# Altium footprint library ESP8266.PcbLib: 13 footprints
Each footprint in its own frame and in the unit in brackets; x right, y up, seen from the top. Pads: shape width x height; smd on the part's side, far side on the other; paste and mask are expansions set on the pad; w line width, h text height; cw(c..) or ccw(c..) is an arc to the next point about the centre after c.
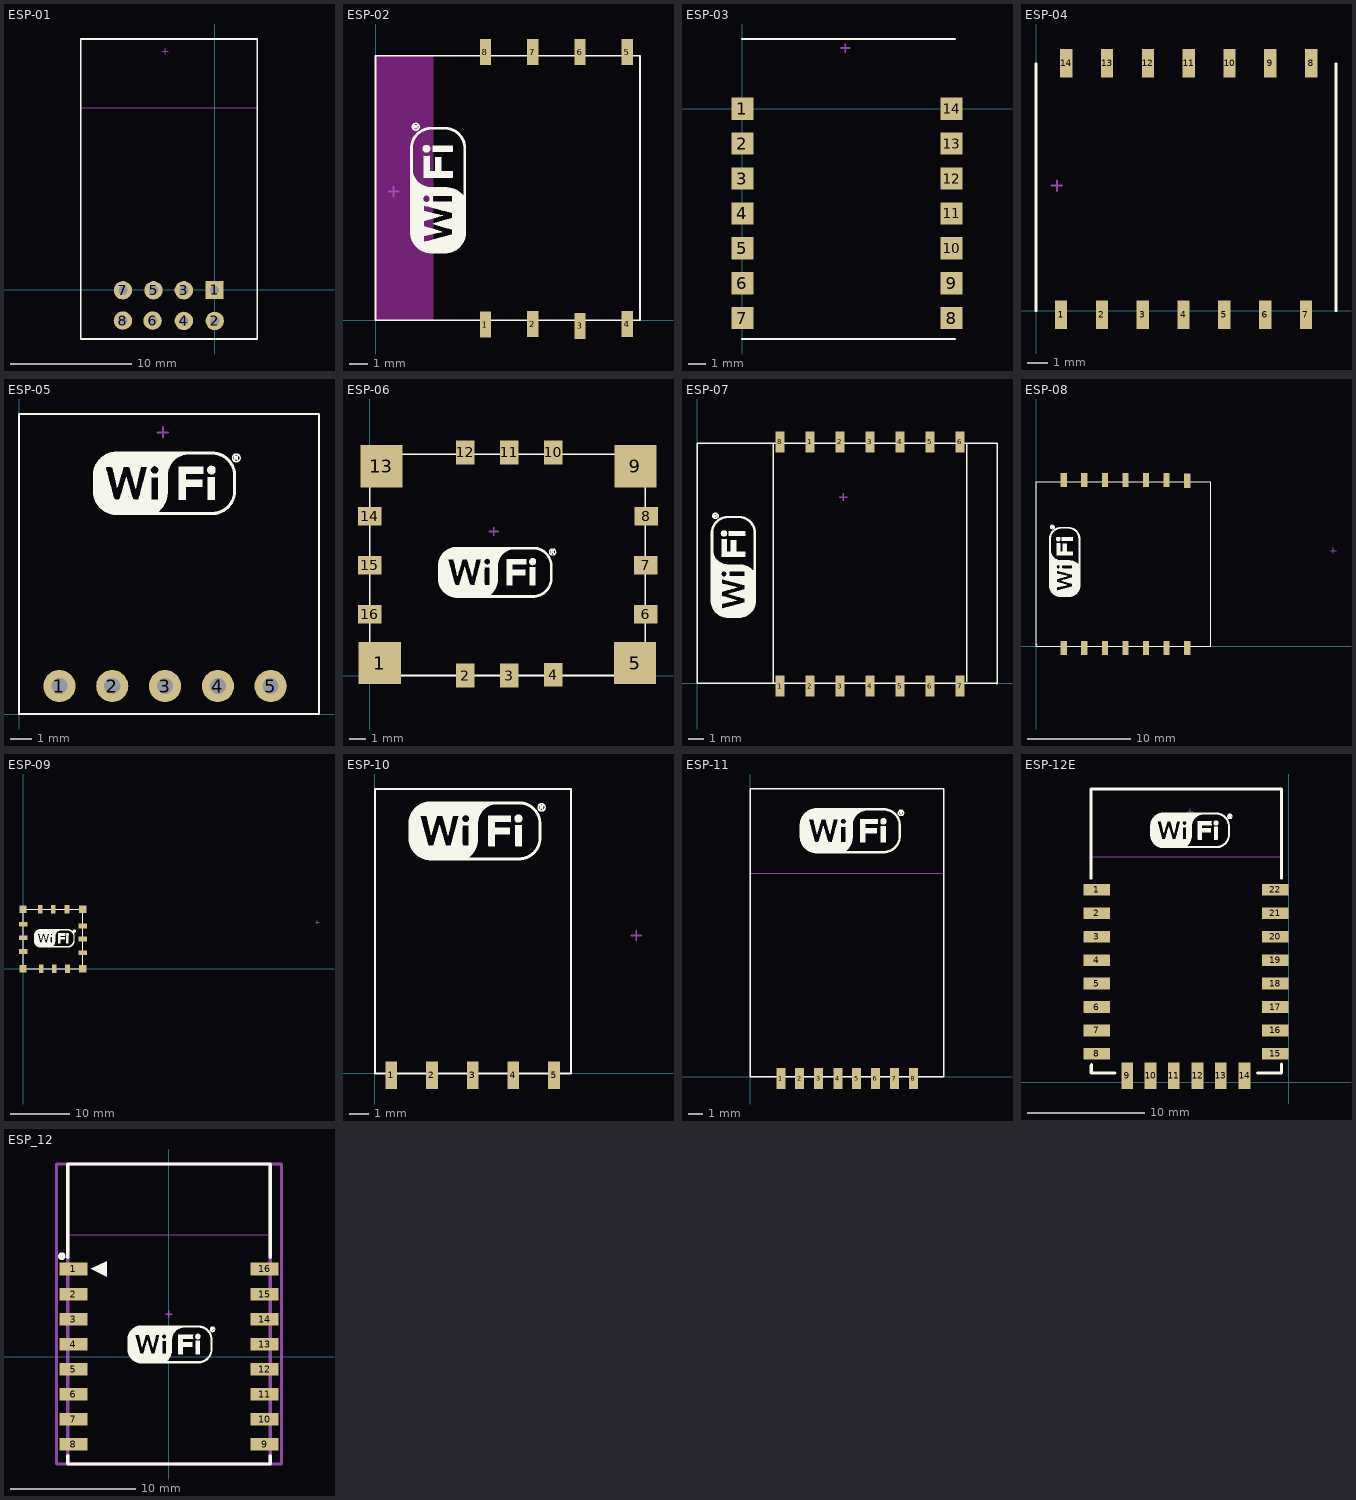
[diagram p0: the footprints below, top view; thin cyan lines are the x and y axes]

## ESP-01 [mil] "ESP-01"
pads (8):
  rect 60x60 hole 30: 1(0,0)
  round 60 hole 30: 2(1,-101) 3(-100,-1) 4(-100,-101) 5(-199,-1) 6(-202,-100) 7(-299,-1) 8(-299,-100)
Top Overlay:
  lines w5: -436,-160 139,-160 139,819 -436,819 -436,-160
Mechanical 13:
  lines w2: -435.96,594.97 139,594.97
  text "ANTENNA AREA" at -425.96,797.59 h10
  text "CUTOUT POLYGON" at -425.96,777.59 h10
Mechanical 15:
  lines w3.94: -171,778.92 -151,778.92 ; -161,768.92 -161,788.92
3D body "User Library-Wi07C.step": height 231.4, standoff -228.35, extent -435,-160 135.87,816.38

## ESP-02 [mm] "ESP-02"
pads (8):
  rect 0.6x1.4 smd: 1(5.893,-0.229) 2(8.433,-0.203) 3(10.973,-0.305) 4(13.513,-0.203) 5(13.513,14.402) 6(10.973,14.402) 7(8.433,14.402) 8(5.893,14.402)
Top Layer keep-out:
  region: 0,14.2 0.027,14.173 3.099,14.173 3.099,0.025 3.073,0 0,0
Top Overlay:
  drawing of 1264 lines, arcs and shapes, not listed
  text ".Designator" at 0,-0.965 h1
Mechanical 15:
  lines w0.1: 0.713,6.909 1.221,6.909 ; 0.967,6.655 0.967,7.163
3D body: height 0.5, standoff 0, extent 0,0 14.199,14.199
3D body: height 1, standoff 0.5, extent 4.826,3.454 9.144,7.95
3D body: height 1, standoff 0.5, extent 10.63,4.635 13.094,6.896

## ESP-03 [mm] "ESP-03"
pads (14):
  rect 1.27x1.27 smd: 1(0,0) 2(0,-2) 3(0,-4) 4(0,-6) 5(0,-8) 6(0,-10) 7(0,-12) 8(12,-12) 9(12,-10) 10(12,-8) 11(12,-6) 12(12,-4) 13(12,-2) 14(12,0)
Top Overlay:
  lines w0.127: 0,-13.2 12.2,-13.2 ; 0,4 12.2,4
Mechanical 15:
  lines w0.1: 5.639,3.478 6.147,3.478 ; 5.893,3.224 5.893,3.732
3D body "User Library-ESP-03.STEP": height 3.43, standoff -0.01, extent -0.054,-13.259 12.246,4.041

## ESP-04 [mm] "ESP-04"
pads (14):
  rect 0.6x1.4 smd: 1(1.229,-0.203) 2(3.229,-0.203) 3(5.229,-0.203) 4(7.229,-0.203) 5(9.229,-0.203) 6(11.229,-0.203) 7(13.229,-0.203) 8(13.483,12.116) 9(11.483,12.116) 10(9.483,12.116) 11(7.483,12.116) 12(5.483,12.116) 13(3.483,12.116) 14(1.483,12.116)
Top Overlay:
  lines w0.127: 0,0 0,12.1 ; 14.7,0 14.7,12.1
Mechanical 15:
  lines w0.1: 0.764,6.121 1.272,6.121 ; 1.018,5.867 1.018,6.375

## ESP-05 [mil] "ESP-05"
pads (5):
  round 60 hole 30: 1(75.3,52) 2(173.72,52) 3(272.15,52) 4(370.57,52) 5(469,52)
Top Overlay:
  drawing of 1264 lines, arcs and shapes, not listed
  text ".Designator" at 1,-40 h39.37
Mechanical 15:
  lines w3.94: 258,524.92 278,524.92 ; 268,514.92 268,534.92
3D body: height 39.37, standoff 19.68, extent 325,138 422,227
3D body: height 39.37, standoff 19.68, extent 105,137 275,314
3D body: height 19.68, standoff 0, extent 0,1 559,559

## ESP-06 [mm] "ESP-06"
pads (16):
  rect 2.5x2.5 smd: 1(0.584,0.737) 5(15.697,0.737) 9(15.723,12.395) 13(0.686,12.395)
  rect 1.1x1.4 smd: 2(5.648,0) 3(8.248,0) 4(10.848,0.051) 10(10.848,13.208) 11(8.248,13.208) 12(5.648,13.208)
  rect 1.4x1.1 smd: 6(16.332,3.642) 7(16.332,6.542) 8(16.358,9.442) 14(0,9.442) 15(0,6.542) 16(0,3.642)
Top Overlay:
  drawing of 1264 lines, arcs and shapes, not listed
  text ".Designator" at -0.686,-1.651 h1
Mechanical 15:
  lines w0.1: 7.087,8.532 7.595,8.532 ; 7.341,8.278 7.341,8.786
3D body: height 1, standoff 0.5, extent 9.322,3.241 11.786,5.501
3D body: height 1, standoff 0.5, extent 3.734,3.215 8.052,7.711
3D body: height 0.5, standoff 0, extent 0,0 16.281,13.081

## ESP-07 [mm] "ESP-01"
pads (14):
  rect 0.6x1.4 smd: 1(5.533,-0.178) 1(7.533,16.104) 2(7.533,-0.178) 2(9.533,16.104) 3(9.533,-0.178) 3(11.533,16.104) 4(11.533,-0.178) 4(13.533,16.104) 5(13.533,-0.178) 5(15.533,16.104) 6(15.533,-0.178) 6(17.533,16.104) 7(17.533,-0.178) 8(5.533,16.104)
Top Overlay:
  drawing of 1267 lines, arcs and shapes, not listed
  text ".Designator" at 0,-1.702 h1
Mechanical 15:
  lines w0.1: 9.5,12.419 10.008,12.419 ; 9.754,12.165 9.754,12.673
3D body: height 0.5, standoff 0, extent 0,0 20.041,16.002
3D body: height 1, standoff 0.5, extent 7.772,2.565 12.09,7.061
3D body: height 1, standoff 0.5, extent 13.36,2.591 15.824,4.851

## ESP-08 [mm] "ESP-08"
pads (14):
  rect 0.6x1.4 smd: 1(2.695,-0.178) 2(4.695,-0.178) 3(6.695,-0.178) 4(8.695,-0.178) 5(10.695,-0.178) 6(12.695,-0.178) 7(14.695,-0.178) 8(14.695,16.078) 9(12.695,16.154) 10(10.695,16.154) 11(8.695,16.154) 12(6.695,16.154) 13(4.695,16.154) 14(2.695,16.154)
Top Overlay:
  drawing of 1265 lines, arcs and shapes, not listed
  text ".Designator" at -0.229,-1.499 h1
Mechanical 15:
  lines w0.1: 28.651,9.294 29.159,9.294 ; 28.905,9.04 28.905,9.548
3D body: height 1, standoff 0.5, extent 10.338,2.591 12.802,4.851
3D body: height 1, standoff 0.5, extent 4.75,2.565 9.068,7.061
3D body: height 0.5, standoff 0, extent 0,0 17.018,16.002

## ESP-09 [mm] "ESP-09"
pads (16):
  rect 1.2x1.2 smd: 1(0,0) 5(10,0) 9(10,10) 13(0,10)
  rect 0.8x1.4 smd: 2(3.023,0) 3(5.232,0) 4(7.442,0) 10(7.366,10) 11(5.055,10) 12(2.87,10)
  rect 1.4x0.8 smd: 6(10,2.692) 7(10,4.978) 8(10,7.188) 14(0,7.493) 15(0,5.194) 16(0,2.896)
Top Overlay:
  drawing of 1264 lines, arcs and shapes, not listed
  text ".Designator" at -0.635,-1.651 h1
Mechanical 15:
  lines w0.1: 49.2,7.796 49.708,7.796 ; 49.454,7.542 49.454,8.05
3D body: height 1, standoff 0.5, extent 2.565,2.769 7.061,7.087
3D body: height 0.5, standoff 0, extent 0,0 10.008,10.008

## ESP-10 [mm] "ESP-10"
pads (5):
  rect 0.6x1.4 smd: 1(0.838,-0.102) 2(2.915,-0.102) 3(4.991,-0.102) 4(7.068,-0.102) 5(9.144,-0.102)
Top Overlay:
  drawing of 1264 lines, arcs and shapes, not listed
  text ".Designator" at 0,-1.803 h1
Mechanical 15:
  lines w0.1: 13.081,7.034 13.589,7.034 ; 13.335,6.78 13.335,7.288
3D body: height 0.5, standoff 0, extent 0,0 10.008,14.478
3D body: height 1, standoff 0.5, extent 0.889,5.41 5.385,9.728
3D body: height 1, standoff 0.5, extent 0.914,1.676 3.175,4.14

## ESP-11 [mm] "ESP-11"
pads (8):
  rect 0.6x1.4 smd: 1(2.057,-0.127) 2(3.327,-0.127) 3(4.597,-0.127) 4(5.893,-0.127) 5(7.137,-0.127) 6(8.407,-0.127) 7(9.677,-0.127) 8(10.947,-0.127)
Top Overlay:
  drawing of 1264 lines, arcs and shapes, not listed
  text ".Designator" at 0,-1.93 h1
Mechanical 13:
  lines w0.051: 0.026,13.639 13,13.64
  text "CUTOUT POLYGON" at 0.28,18.278 h0.25
  text "ANTENNA AREA" at 0.28,18.786 h0.25
Mechanical 15:
  lines w0.1: 6.35,17.346 6.858,17.346 ; 6.604,17.092 6.604,17.6
3D body: height 0.5, standoff 0, extent 0,0 13.005,19.304
3D body: height 1, standoff 0.5, extent 2.718,7.671 7.214,11.989
3D body: height 1, standoff 0.5, extent 2.743,3.937 5.004,6.401

## ESP-12E [mm] "ESP-12E"
pads (22):
  rect 2.25x1 smd: 1(-16.408,16.408) 2(-16.408,14.408) 3(-16.408,12.408) 4(-16.408,10.408) 5(-16.408,8.408) 6(-16.408,6.408) 7(-16.408,4.408) 8(-16.408,2.408) 15(-1.158,2.408) 16(-1.158,4.408) 17(-1.158,6.408) 18(-1.158,8.408) 19(-1.158,10.408) 20(-1.158,12.408) 21(-1.158,14.408) 22(-1.158,16.408)
  rect 1x2.25 smd: 9(-13.792,0.533) 10(-11.811,0.533) 11(-9.83,0.533) 12(-7.798,0.533) 13(-5.817,0.533) 14(-3.785,0.533)
Top Overlay:
  drawing of 1268 lines, arcs and shapes, not listed
Mechanical 13:
  lines w0.051: -16.839,19.252 -0.583,19.252
  text "CUTOUT POLYGON" at -16.585,23.891 h0.25
  text "ANTENNA AREA" at -16.585,24.399 h0.25
Mechanical 15:
  lines w0.1: -8.661,23.061 -8.153,23.061 ; -8.407,22.807 -8.407,23.315
3D body "ESP_12_ENew.STEP": height 3.82, standoff -0.05, extent -16.82,0.887 -0.806,24.918

## ESP_12 [mm] "ESP-12"
height 3.2
pads (16):
  rect 2.25x1 smd: 1(-7.625,7) 2(-7.625,5) 3(-7.625,3) 4(-7.625,1) 5(-7.625,-1) 6(-7.625,-3) 7(-7.625,-5) 8(-7.625,-7) 9(7.625,-7) 10(7.625,-5) 11(7.625,-3) 12(7.625,-1) 13(7.625,1) 14(7.625,3) 15(7.625,5) 16(7.625,7)
Top Overlay:
  drawing of 1268 lines, arcs and shapes, not listed
  text ".Designator" at -8.433,-9.398 h1
Mechanical 13:
  lines w0.051: -8.127,9.727 -8.127,15.382 8.129,15.382 8.129,9.727 -8.127,9.727
  lines w0.254: -8.084,-8.568 8.084,-8.568 8.084,15.371 -8.084,15.371 -8.084,-8.568
  text "CUTOUT POLYGON" at -7.873,14.366 h0.25
  text "ANTENNA AREA" at -7.873,14.874 h0.25
Mechanical 15:
  lines w0.1: -0.254,3.402 0.254,3.402 ; 0,3.148 0,3.656
  lines w0.254: -8.975,-8.568 -8.975,15.371 8.975,15.371 8.975,-8.568 -8.975,-8.568
3D body "ESP_12_ENew.STEP": height 3.82, standoff -0.05, extent -7.859,-8.522 8.156,15.509